# Altium footprint library 元件库PCB.PcbLib: 63 footprints (part 2 of 4)
Each footprint in its own frame and in the unit in brackets; x right, y up, seen from the top. Pads: shape width x height; smd on the part's side, far side on the other; paste and mask are expansions set on the pad; w line width, h text height; cw(c..) or ccw(c..) is an arc to the next point about the centre after c.
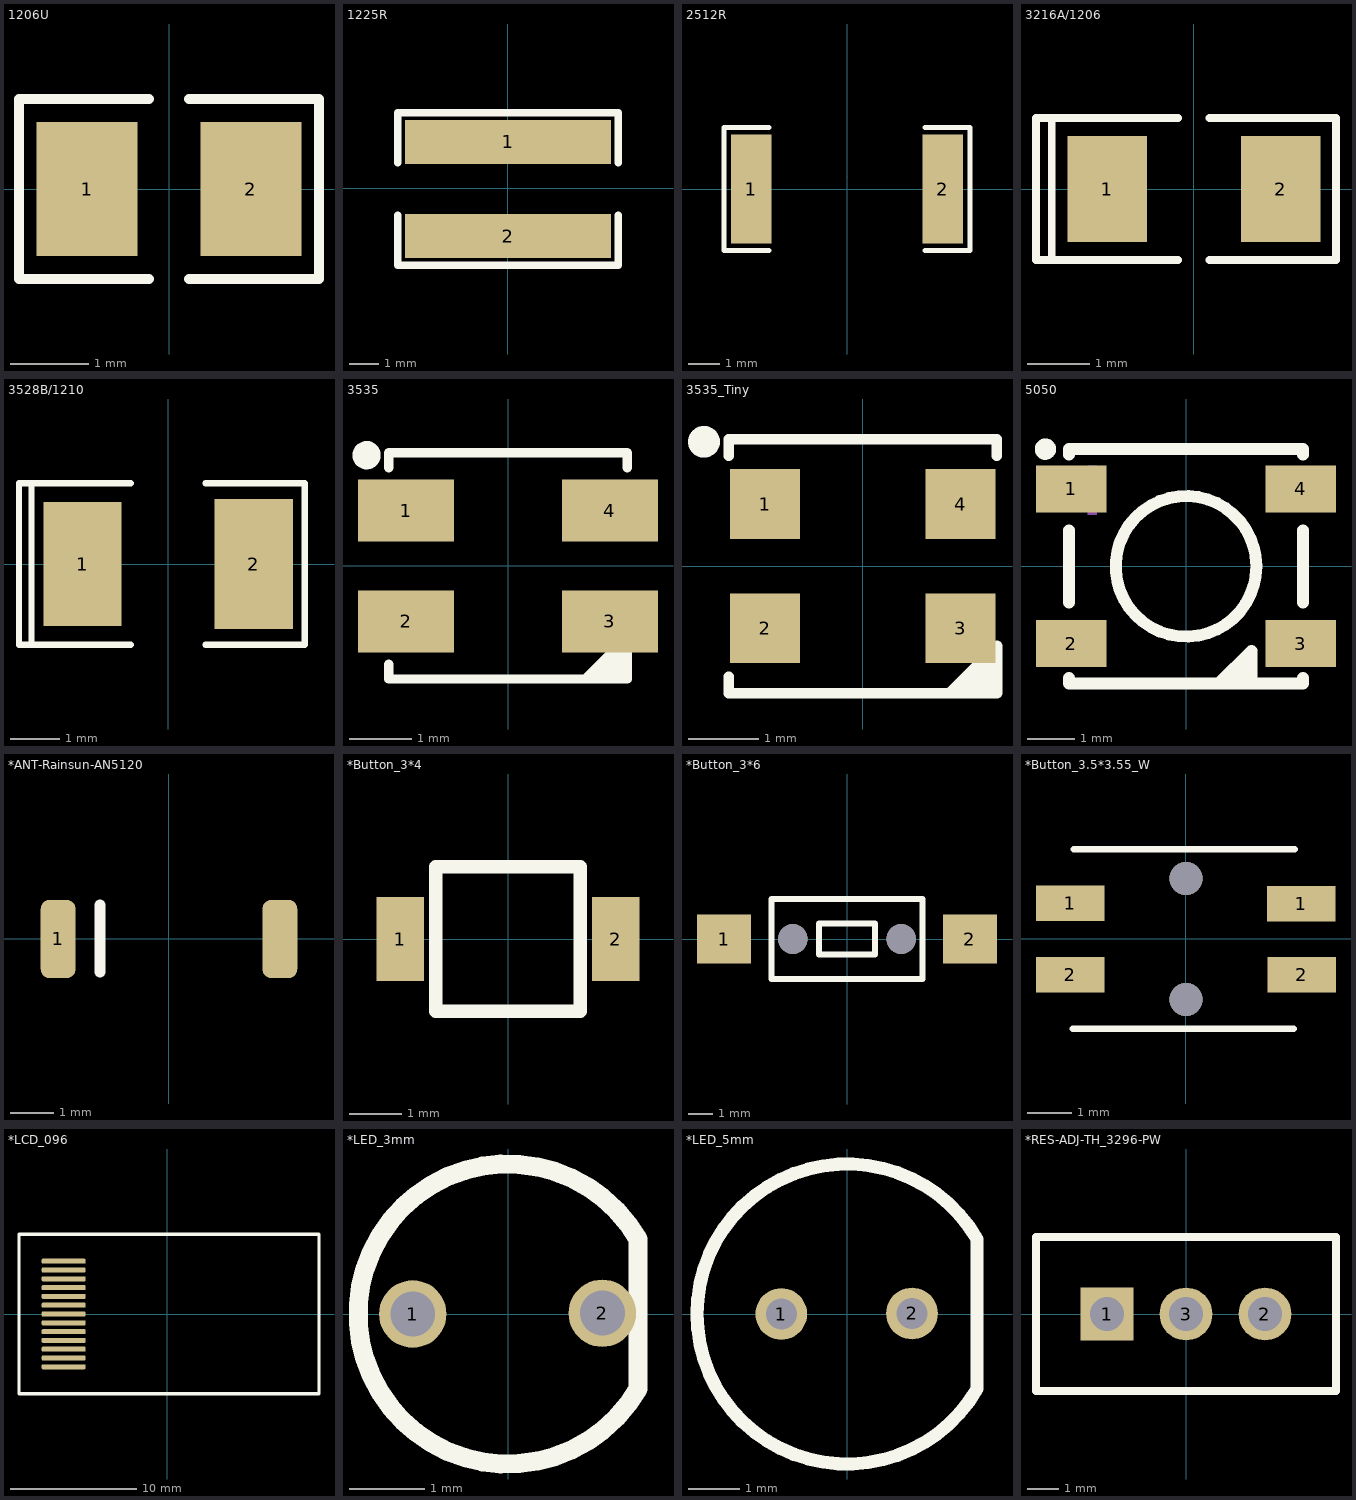
[diagram p1: the footprints below, top view; thin cyan lines are the x and y axes]

## 1206U [mm] "通锟斤拷1206锟斤拷装"
pads (2):
  rect 1.28x1.7 smd: 1(-1.04,0) 2(1.04,0)
Top Overlay:
  lines w0.127: -0.254,-1.143 -1.905,-1.143 -1.905,1.143 -0.254,1.143 ; 0.254,-1.143 1.905,-1.143 1.905,1.143 0.254,1.143

## 1225R [mm]
pads (2):
  rect 7x1.5 smd: 1(0.006,1.574) 2(0.006,-1.626)
Top Overlay:
  lines w0.254: -3.744,-0.926 -3.744,-2.626 3.756,-2.626 3.756,-0.926 ; -3.744,0.874 -3.744,2.574 3.756,2.574 3.756,0.874
3D body "User Library-wk733a.step": height 0.52, standoff -0.1, extent -3.15,-1.576 3.15,1.524

## 2512R [mil]
pads (2):
  rect 50.49x136.06 smd: 1(-120,0) 2(120,0)
Top Overlay:
  lines w6: -97.75,-77.03 -154.25,-77.03 -154.25,77.03 -97.75,77.03 ; 97.75,-77.03 154.25,-77.03 154.25,77.03 97.75,77.03
Top Paste:
  region: 94.75,64.09 94.75,27.07 98.69,23.13 107.98,23.13 111.92,19.19 111.92,-19.19 107.98,-23.13 98.69,-23.13 94.75,-27.07 94.75,-64.09 98.69,-68.03 141.31,-68.03 145.25,-64.09 145.25,64.09 141.31,68.03 98.69,68.03
  region: -94.75,-64.09 -94.75,-27.07 -98.69,-23.13 -107.98,-23.13 -111.92,-19.19 -111.92,19.19 -107.98,23.13 -98.69,23.13 -94.75,27.07 -94.75,64.09 -98.69,68.03 -141.31,68.03 -145.25,64.09 -145.25,-64.09 -141.31,-68.03 -98.69,-68.03
Mechanical 15:
  lines w0.1: 0.71,16.22 0.73,16.24
3D body "CircuitWorks-RESISTOR 2512.step": height 22.83, standoff -1.18, extent -125,-64.17 125,64.17

## 3216A/1206 [mm] "1206锟斤拷装锟斤拷锟斤拷锟斤拷锟紸锟斤拷锟矫ｏ拷缺锟斤拷为锟斤拷锟斤拷锟斤拷锟斤拷/锟斤拷锟斤拷"
pads (2):
  rect 1.28x1.7 smd: 1(-1.397,0) 2(1.397,0)
Top Overlay:
  lines w0.127: -0.254,-1.143 -2.286,-1.143 ; -0.254,1.143 -2.286,1.143 ; 0.254,-1.143 2.286,-1.143 2.286,1.143 0.254,1.143 ; -2.286,-1.143 -2.54,-1.143 -2.54,1.143 -2.286,1.143 ; -2.286,-1.143 -2.286,1.143
3D body "User Library-AVX_ACASE.STEP": height 1.71, standoff 0, extent -1.7,-0.84 1.7,0.84

## 3528B/1210 [mm] "1210锟斤拷装锟斤拷锟斤拷锟斤拷锟紹锟斤拷锟矫ｏ拷缺锟斤拷为锟斤拷锟斤拷锟斤拷锟斤拷/锟斤拷锟斤拷"
pads (2):
  rect 1.6x2.54 smd: 1(-1.75,0)
  rect 1.6x2.667 smd: 2(1.75,0)
Top Overlay:
  lines w0.127: -0.762,-1.651 -2.794,-1.651 ; -0.762,1.651 -2.794,1.651 ; 0.762,-1.651 2.794,-1.651 2.794,1.651 0.762,1.651 ; -2.794,-1.651 -2.794,1.651 ; -2.794,-1.651 -3.048,-1.651 -3.048,1.651 -2.794,1.651
3D body "User Library-AVX_BCASE.step": height 2.03, standoff 0, extent -1.85,-1.465 1.85,1.465

## 3535 [mm]
pads (4):
  rect 1.545x0.997 smd: 1(-1.638,0.89) 2(-1.638,-0.89) 3(1.638,-0.89) 4(1.638,0.89)
Top Overlay:
  circle w0.254: c-2.273,1.779 r0.1
  region: 1.247,-1.814 1.918,-1.814 1.918,-1.142
  lines w0.152: -1.916,-1.579 -1.916,-1.816 1.916,-1.816 1.916,-1.579 ; -1.916,1.579 -1.916,1.816 1.916,1.816 1.916,1.579 ; 1.247,-1.814 1.916,-1.814 1.247,-1.814 ; 1.247,-1.814 1.918,-1.142 1.918,-1.814 1.247,-1.814
3D body "SMD WS2812B Mini.step": height 1.91, standoff -0.05, extent -1.84,-1.74 1.84,1.74

## 3535_Tiny [mil]
pads (4):
  rect 39.37x39.25 smd: 1(-55,35) 2(-55,-35) 3(55,-35) 4(55,35)
Top Overlay:
  circle w10: c-89.47,70.04 r3.94
  region: 49.08,-71.41 75.53,-71.41 75.53,-44.96
  lines w6: -75.44,-62.16 -75.44,-71.5 75.44,-71.5 75.44,-62.16 ; -75.44,62.16 -75.44,71.5 75.44,71.5 75.44,62.16 ; 49.08,-71.41 75.53,-71.41 75.53,-44.96 49.08,-71.41 ; 49.08,-71.41 75.44,-71.41 49.08,-71.41
3D body "SMD WS2812B Mini.step": height 75, standoff -1.77, extent -72.44,-68.5 72.44,68.5

## 5050 [mm] "5050锟斤拷装锟斤拷锟斤拷为锟斤拷锟斤拷锟斤拷缺锟斤拷为锟斤拷锟斤拷"
pads (4):
  rect 1.5x1 smd: 1(-2.451,1.65) 2(-2.451,-1.65) 3(2.449,-1.65) 4(2.449,1.65)
Top Overlay:
  circle w0.254: c0,0 r1.5
  circle w0.254: c-3.001,2.5 r0.1
  region: 1.399,-1.8 1.399,-2.4 1.299,-2.5 0.699,-2.5
  lines w0.254: -2.501,-2.38 -2.501,-2.5 2.499,-2.5 2.499,-2.38 ; -2.501,-0.77 -2.501,0.77 ; -2.501,2.38 -2.501,2.5 2.499,2.5 2.499,2.38 ; 2.499,-0.77 2.499,0.77 ; 0.699,-2.5 1.399,-2.5 1.399,-1.8 0.699,-2.5
Mechanical 15:
  circle w0.24: c-2.801,1.9 r0.12
  region: -2.101,1.1 -2.101,2.15 -1.901,2.15 -1.901,1.1
3D body "User Library-WS2812B.step": height 1.7, standoff 0, extent -2.7,-2.5 2.7,2.5

## *ANT-Rainsun-AN5120 [mm]
pads (2):
  rrect50% 0.8x1.8 smd: 1(-2.551,0) ""(2.552,0)
Top Overlay:
  lines w0.254: -1.586,-0.762 -1.586,0.787
3D body "123.stp": height 1.32, standoff -0.01, extent -2.585,-0.911 2.53,0.935

## *Button_3*4 [mm]
pads (2):
  rect 0.9x1.6 smd: 1(-2.05,0) 2(2.05,0)
Top Overlay:
  lines w0.254: -1.373,-1.373 1.373,-1.373 1.373,1.373 -1.373,1.373 -1.373,-1.373
3D body "按键.step": height 1.9, standoff 0, extent -2.4,-1.524 2.4,1.476

## *Button_3*6 [mm]
pads (4):
  rect 2.2x2 smd: 1(-5,0) 2(5,0)
  round 1.2 hole 1.2: ""(-2.2,0) ""(2.2,0)
Top Overlay:
  lines w0.254: -3.073,-1.623 3.073,-1.623 3.073,1.623 -3.073,1.623 -3.073,-1.623 ; -1.143,-0.635 1.143,-0.635 1.143,0.635 -1.143,0.635 -1.143,-0.635
3D body "按键_轻触3mm_6mm.step": height 3, standoff 0, extent -5.2,-1.722 5.2,1.778

## *Button_3.5*3.55_W [mm]
height 4.3
pads (4):
  rect 1.55x0.8 smd: 1(-2.625,0.813) 1(2.616,0.802) 2(-2.625,-0.813) 2(2.625,-0.813)
via 0,1.375 diameter 0.75 hole 0.75
via 0,-1.375 diameter 0.75 hole 0.75
Top Overlay:
  lines w0.152: -2.565,-2.032 2.435,-2.032 ; -2.538,2.032 2.462,2.032
3D body "User Library-KMS231G.STEP": height 1.42, standoff -0.02, extent -2.314,-1.394 2.286,2.156

## *LCD_096 [mm]
pads (13):
  rrect50% 3.5x0.4 smd: 1(-8.255,-4.2) 2(-8.255,-3.5) 3(-8.255,-2.8) 4(-8.255,-2.1) 5(-8.255,-1.4) 6(-8.255,-0.7) 7(-8.255,0) 8(-8.255,0.7) 9(-8.255,1.4) 10(-8.255,2.1) 11(-8.255,2.8) 12(-8.255,3.5) 13(-8.255,4.2)
Top Overlay:
  lines w0.254: -11.811,-6.35 12.065,-6.35 12.065,6.35 -11.811,6.35 -11.811,-6.35
3D body "Ctrl-DualBoard-Down v1.step": height 1.55, standoff 0.09, extent -15.795,-6.25 11.927,6.25

## *LED_3mm [mm]
pads (2):
  round 0.9 hole 0.6: 1(-1.27,0) 2(1.257,0.01)
Top Overlay:
  lines w0.254: 1.732,-1 cw(c0,0) 1.732,1 1.732,-1
3D body "everlight-IR204-A.step": height 5.22, standoff -7.35, extent -1.9,-1.9 1.526,1.9

## *LED_5mm [mm]
pads (2):
  round 1 hole 0.6: 1(-1.27,0) 2(1.257,0.01)
Top Overlay:
  lines w0.254: 2.511,-1.45 cw(c0,0) 2.511,1.45 2.511,-1.45
3D body "everlight-5MM-LED-CLEAR.step": height 8.65, standoff -7.32, extent -2.95,-2.95 2.5,2.95

## *RES-ADJ-TH_3296-PW [mm] "锟斤拷*专锟矫凤拷装锟斤拷3296锟斤拷位锟斤拷专锟矫凤拷装"
pads (3):
  rect 1.7x1.7 hole 1.1: 1(-2.54,0)
  round 1.7 hole 1.1: 2(2.54,0) 3(0,0)
Top Overlay:
  lines w0.254: -4.826,-2.476 -4.826,2.476 4.826,2.476 4.826,-2.476 -4.826,-2.476
3D body "User Library-3296W-1.step": height 4.42, standoff -0.41, extent -4.765,-0.476 4.765,13.044